# Altium footprint library Mi Libreria.PcbLib: 184 footprints (part 6 of 12)
Each footprint in its own frame and in the unit in brackets; x right, y up, seen from the top. Pads: shape width x height; smd on the part's side, far side on the other; paste and mask are expansions set on the pad; w line width, h text height; cw(c..) or ccw(c..) is an arc to the next point about the centre after c.
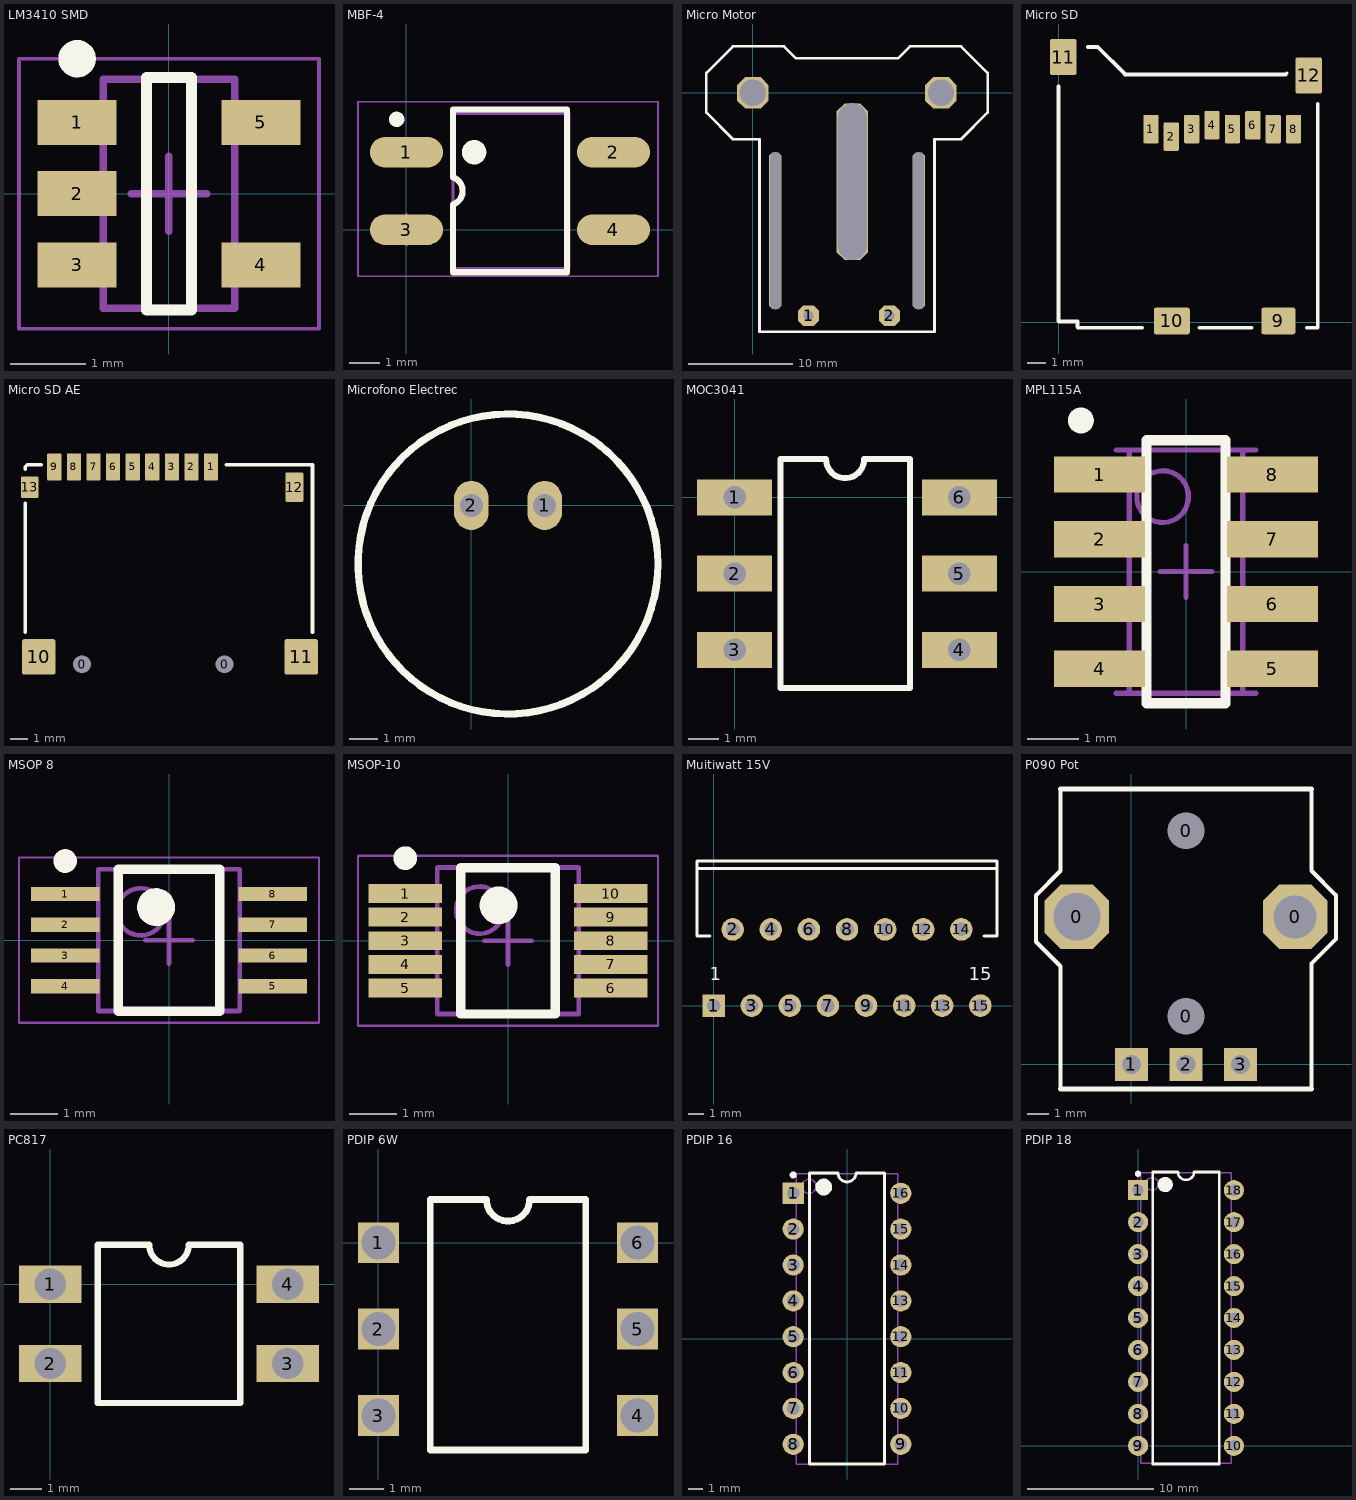
[diagram p5: the footprints below, top view; thin cyan lines are the x and y axes]

## LM3410 SMD [mm] "SOT23127P600-8N"
height 1.45
pads (5):
  rect 1.05x0.6 smd: 1(-1.225,0.95) 2(-1.225,0) 3(-1.225,-0.95) 4(1.225,-0.95) 5(1.225,0.95)
Top Overlay:
  circle w0.25: c-1.225,1.8 r0.125
  lines w0.15: -0.3,-1.55 0.3,-1.55 0.3,1.55 -0.3,1.55 -0.3,-1.55
Mechanical 13:
  lines w0.1: -0.875,-1.525 -0.875,1.525 0.875,1.525 0.875,-1.525 -0.875,-1.525
Mechanical 15:
  lines w0.05: -2,-1.8 -2,1.8 2,1.8 2,-1.8 -2,-1.8
  lines w0.1: -0.5,0 0.5,0 ; 0,-0.5 0,0.5
3D body: height 1.45, standoff 0.1, extent -0.875,-1.525 0.875,1.525

## MBF-4 [mm] "MBF-4 SMT Bridge Rectifier Low Power"
height 2
pads (4):
  oval 2.4x1 smd: 1(0,2.54) 2(6.794,2.54) 3(0,0) 4(6.794,0)
Top Overlay:
  circle w0.25: c-0.318,3.619 r0.125
  circle w0.4: c2.222,2.54 r0.2
  lines w0.2: 1.524,-1.397 1.524,-0.064 1.524,0.826 ccw(c1.378,1.27) 1.524,1.714 1.524,2.603 1.524,3.937 5.271,3.937 5.271,-1.397 1.524,-1.397
Mechanical 13:
  lines w0.1: 1.524,-1.27 1.524,3.81 5.334,3.81 5.334,-1.27 1.524,-1.27
Mechanical 15:
  lines w0.05: -1.587,-1.524 -1.587,4.191 8.255,4.191 8.255,-1.524 -1.587,-1.524
  lines w0.1: -0.5,0 0.5,0 ; 0,-0.5 0,0.5
3D body "MB10F TMBS-1.step": height 1.61, standoff 0, extent 0.042,-1.18 6.842,3.72

## Micro Motor [mm] "Pololu 12Ga Motor"
pads (7):
  oct 2x2 hole 1: 1(5.334,-21.336) 2(13.081,-21.336)
  oct 3x3 hole 2.5: ""(0,0) ""(18,0)
  oct 1.2x15 hole 1 slot 15 at 90 deg: ""(2.159,-13.208) ""(15.875,-13.208)
  oct 3x15 hole 2.75 slot 15 at 90 deg: ""(9.525,-8.509)
Top Overlay:
  lines w0.254: -4.445,-1.905 -1.905,-4.445 0.635,-4.445 0.635,-22.86 17.399,-22.86 17.399,-4.445 19.939,-4.445 22.479,-1.905 22.479,1.905 19.939,4.445 15.05,4.445 13.906,3.302 4.128,3.302 2.985,4.445 -1.905,4.445 -4.445,1.905 -4.445,-1.905
3D body "micro-metal-gearmotor-with-1086-bracket.step": height 11.9, standoff 0.2, extent -4.233,-21.953 22.267,13.317

## Micro SD [mil] "Conector Micro SD"
pads (12):
  rrect15% 32x60 smd: 1(194.84,407.96) 2(237.84,391.96) 3(280.84,407.96) 4(323.84,415.96) 5(366.84,407.96) 6(409.84,415.96) 7(452.84,407.96) 8(495.84,407.96)
  rrect15% 72x56 smd: 9(463.84,2.96)
  rrect15% 76x56 smd: 10(238.84,2.96)
  rrect15% 56x76 smd: 11(9.84,559.96) 12(527.84,520.96)
Top Overlay:
  lines w7.87: -0.16,497.6 -0.16,2.96 0.84,1.96 39.84,1.96 39.84,-9.04 ; 40.84,-11.04 176.02,-11.04 ; 61.85,580.96 82.84,580.96 139.84,523.96 139.84,522.96 478.84,522.96 481.58,525.7 ; 297.09,-11.26 407.32,-11.26 ; 523.46,-11.04 546.84,-11.04 546.84,461.18
3D body "Tyco_microSD_c-1827034-01-b-3d.stp": height 74.05, standoff 0, extent -2.13,-9.29 551.02,589.13

## Micro SD AE [mm] "Micro SD Conector AR"
pads (15):
  round 0.9 hole 1: 0(5.227,4.157) 0(13.227,4.157)
  rrect15% 0.8x1.524 smd: 1(12.469,15.24) 2(11.369,15.24) 3(10.269,15.24) 4(9.169,15.24) 5(8.069,15.24) 6(6.969,15.24) 7(5.869,15.24) 8(4.769,15.24) 9(3.669,15.24)
  rrect15% 1.9x2 smd: 10(2.794,4.572) 11(17.526,4.572)
  rrect15% 1x1.65 smd: 12(17.145,14.097)
  rrect15% 1x1.2 smd: 13(2.286,14.097)
Top Overlay:
  lines w0.2: 2.032,5.969 2.032,13.208 ; 2.032,15.113 2.032,15.24 2.159,15.367 2.921,15.367 ; 13.335,15.367 18.161,15.367 18.161,5.969
3D body "MICRO SD AE.step": height 1.95, standoff -0.5, extent 2.159,0.117 18.159,15.367

## Microfono Electrec [mm] "Microphone Electrec"
pads (2):
  oval 1.2x1.7 hole 0.8: 1(2.54,0) 2(0,0)
Top Overlay:
  circle w0.254: c1.27,-2.032 r5.2
3D body "MICROFONO.step": height 5.55, standoff -3.62, extent -3.58,-6.906 6.12,2.794

## MOC3041 [mm] "PDIP 6,"
pads (6):
  rect 2.5x1.2 hole 0.75: 1(0,0) 2(0,-2.54) 3(0,-5.08) 4(7.493,-5.08) 5(7.493,-2.54) 6(7.493,0)
Top Overlay:
  lines w0.2: 1.524,-6.35 5.842,-6.35 5.842,1.27 4.318,1.27 cw(c3.683,1.27) 3.048,1.27 1.524,1.27 1.524,-6.35
3D body "MOC30.STEP": height 5.3, standoff -2, extent -0.125,-6.096 7.745,1.024

## MPL115A [mm] "TQFP, 8-Leads, Body 2.68x4.68mm, Pitch 1.25mm, IPC Medium Density"
height 1
pads (8):
  rect 1.75x0.7 smd: 1(-1.671,1.875) 2(-1.671,0.625) 3(-1.671,-0.625) 4(-1.671,-1.875) 5(1.671,-1.875) 6(1.671,-0.625) 7(1.671,0.625) 8(1.671,1.875)
Top Overlay:
  circle w0.25: c-2.032,2.921 r0.125
  lines w0.2: -0.762,-2.54 -0.762,2.54 0.762,2.54 0.762,-2.54 -0.762,-2.54
Mechanical 13:
  circle w0.1: c-0.45,1.45 r0.5
  lines w0.1: -1.35,-2.35 1.35,-2.35 ; -1.35,2.35 1.35,2.35 ; -1.096,-2.35 -1.096,2.35 ; 1.096,-2.35 1.096,2.35
Mechanical 15:
  lines w0.1: -0.5,0 0.5,0 ; 0,-0.5 0,0.5
3D body: height 1, standoff 0.05, extent -1.35,-2.35 1.35,2.35

## MSOP 8 [mm]
height 2
pads (8):
  rect 1.45x0.3 smd: 1(-2.2,0.975) 2(-2.2,0.325) 3(-2.2,-0.325) 4(-2.2,-0.975) 5(2.2,-0.975) 6(2.2,-0.325) 7(2.2,0.325) 8(2.2,0.975)
Top Overlay:
  circle w0.25: c-2.2,1.675 r0.125
  circle w0.4: c-0.275,0.7 r0.2
  lines w0.2: -1.075,-1.5 -1.075,1.5 1.075,1.5 1.075,-1.5 -1.075,-1.5
Mechanical 13:
  circle w0.1: c-0.6,0.6 r0.5
  lines w0.1: -1.5,-1.5 -1.5,1.5 1.5,1.5 1.5,-1.5 -1.5,-1.5
Mechanical 15:
  lines w0.05: -3.175,-1.75 -3.175,1.75 3.175,1.75 3.175,-1.75 -3.175,-1.75
  lines w0.1: -0.5,0 0.5,0 ; 0,-0.5 0,0.5
3D body "MSOP-8 Natl Semi MUY08A.step": height 1.09, standoff -0.01, extent -2.5,-1.524 2.5,1.476

## MSOP-10 [mm] "SMD IC MSOP"
height 1.1
pads (10):
  rect 1.55x0.4 smd: 1(-2.175,1) 2(-2.175,0.5) 3(-2.175,0) 4(-2.175,-0.5) 5(-2.175,-1) 6(2.175,-1) 7(2.175,-0.5) 8(2.175,0) 9(2.175,0.5) 10(2.175,1)
Top Overlay:
  circle w0.25: c-2.175,1.75 r0.125
  circle w0.4: c-0.2,0.75 r0.2
  lines w0.2: -1,-1.55 -1,1.55 1,1.55 1,-1.55 -1,-1.55
Mechanical 13:
  circle w0.1: c-0.6,0.65 r0.5
  lines w0.1: -1.5,-1.55 -1.5,1.55 1.5,1.55 1.5,-1.55 -1.5,-1.55
Mechanical 15:
  lines w0.05: -3.175,-1.8 -3.175,1.8 3.175,1.8 3.175,-1.8 -3.175,-1.8
  lines w0.1: -0.5,0 0.5,0 ; 0,-0.5 0,0.5
3D body "MSOP-10-1.STEP": height 1.05, standoff 0, extent -2.514,-1.5 2.514,1.5

## Muitiwatt 15V [mm] "Power Multiwatt"
pads (15):
  rect 1.5x1.5 hole 0.9: 1(0,0)
  round 1.5 hole 0.9: 2(1.27,5.08) 3(2.54,0) 4(3.81,5.08) 5(5.08,0) 6(6.35,5.08) 7(7.62,0) 8(8.89,5.08) 9(10.16,0) 10(11.43,5.08) 11(12.7,0) 12(13.97,5.08) 13(15.24,0) 14(16.51,5.08) 15(17.78,0)
Top Overlay:
  lines w0.2: -1.11,9.13 18.89,9.13 ; -0.254,4.63 -1.11,4.63 -1.11,9.63 18.89,9.63 18.89,4.63 18.034,4.63
  text "1" at -0.254,1.397 h1.5
  text "15" at 17.018,1.397 h1.5
3D body "Multiwatt L298.step": height 20.9, standoff -1.4, extent -0.889,-0.373 18.711,9.517

## P090 Pot [mm] "Potenciometro Axial CUT"
pads (7):
  oct 3x3 hole 2.2: 0(-2.54,6.873)
  round 1.524 hole 1.7: 0(2.54,2.25) 0(2.54,10.886)
  oct 3x3 hole 2: 0(7.62,6.873)
  rect 1.524x1.524 hole 0.9: 1(0,0) 2(2.54,0) 3(5.08,0)
Top Overlay:
  lines w0.2: -3.302,-1.143 -3.302,4.572 -4.445,5.715 -4.445,7.874 -3.302,9.017 -3.302,12.827 ; 8.382,-1.143 8.382,4.699 9.525,5.842 9.525,7.874 8.382,9.017 8.382,12.827
  lines w0.254: -3.302,-1.143 8.382,-1.143 ; -3.302,12.827 8.382,12.827
3D body "P090S-topadjust.step": height 21.84, standoff -2.18, extent -3.097,-0.254 8.177,12.396

## PC817 [mm] "OPTOACOPLADOR"
pads (4):
  rect 2x1.2 hole 1: 1(0,0) 2(0,-2.54) 3(7.62,-2.54) 4(7.62,0)
Top Overlay:
  lines w0.2: 1.524,-3.81 6.096,-3.81 6.096,1.27 4.445,1.27 cw(c3.81,1.27) 3.175,1.27 1.524,1.27 1.524,-3.81
3D body "PDIP 4.step": height 4.5, standoff -2.5, extent -0.13,-3.565 7.75,1.025

## PDIP 6W [mm] "PDIP 6P WHITE"
pads (6):
  rect 1.2x1.2 hole 1: 1(0,0) 2(0,-2.54) 3(0,-5.08) 4(7.62,-5.08) 5(7.62,-2.54) 6(7.62,0)
Top Overlay:
  lines w0.2: 1.524,-6.096 1.524,1.27 3.175,1.27 ccw(c3.81,1.27) 4.445,1.27 6.096,1.27 6.096,-6.096 1.524,-6.096
3D body "DIP6-White.STEP": height 5.3, standoff -2, extent -0.125,-6.104 7.745,1.016

## PDIP 16 [mm] "PDIP 16 2.54mm Pitch"
pads (16):
  rect 1.5x1.5 hole 0.9: 1(-3.81,10.287)
  round 1.5 hole 0.9: 2(-3.81,7.747) 3(-3.81,5.207) 4(-3.81,2.667) 5(-3.81,0.127) 6(-3.81,-2.413) 7(-3.81,-4.953) 8(-3.81,-7.493) 9(3.81,-7.493) 10(3.81,-4.953) 11(3.81,-2.413) 12(3.81,0.127) 13(3.81,2.667) 14(3.81,5.207) 15(3.81,7.747) 16(3.81,10.287)
Top Overlay:
  circle w0.25: c-3.81,11.587 r0.125
  circle w0.6: c-1.65,10.727 r0.3
  lines w0.2: -2.65,-8.89 -2.65,11.727 -0.635,11.727 ccw(c0,11.727) 0.635,11.727 2.65,11.727 2.65,-8.89 -2.65,-8.89
Mechanical 13:
  circle w0.1: c-2.7,10.777 r0.5
  lines w0.1: -3.6,-8.89 -3.6,11.677 3.6,11.677 3.6,-8.89 -3.6,-8.89
3D body "Socket IC 16P.step": height 5.5, standoff -2.5, extent -5.08,-8.763 5.08,11.557
3D body "DIP16.step": height 8.89, standoff 2.13, extent -4.064,-9.398 3.81,12.192

## PDIP 18 [mm] "IC PDIP 18"
pads (18):
  rect 1.6x1.6 hole 0.9: 1(0,20.32)
  round 1.6 hole 0.9: 2(0,17.78) 3(0,15.24) 4(0,12.7) 5(0,10.16) 6(0,7.62) 7(0,5.08) 8(0,2.54) 9(0,0) 10(7.62,0) 11(7.62,2.54) 12(7.62,5.08) 13(7.62,7.62) 14(7.62,10.16) 15(7.62,12.7) 16(7.62,15.24) 17(7.62,17.78) 18(7.62,20.32)
Top Overlay:
  circle w0.25: c0,21.62 r0.125
  circle w0.6: c2.16,20.76 r0.3
  lines w0.2: 1.16,-1.44 1.16,21.76 3.175,21.76 ccw(c3.81,21.76) 4.445,21.76 6.46,21.76 6.46,-1.44 1.16,-1.44
Mechanical 13:
  circle w0.1: c1.11,20.81 r0.5
  lines w0.1: 0.21,-1.39 0.21,21.71 7.41,21.71 7.41,-1.39 0.21,-1.39
3D body "IC SOCKET DIP 18.step": height 5.2, standoff -2.8, extent -1.27,-1.27 8.89,21.59
3D body "DIP18-1.STEP": height 8.57, standoff 0.19, extent -0.227,-1.333 7.593,21.907